# Altium footprint library HW_HOLLAND_NCDM_MONITOR_R1.PcbLib: 472 footprints (part 3 of 30)
Each footprint in its own frame and in the unit in brackets; x right, y up, seen from the top. Pads: shape width x height; smd on the part's side, far side on the other; paste and mask are expansions set on the pad; w line width, h text height; cw(c..) or ccw(c..) is an arc to the next point about the centre after c.
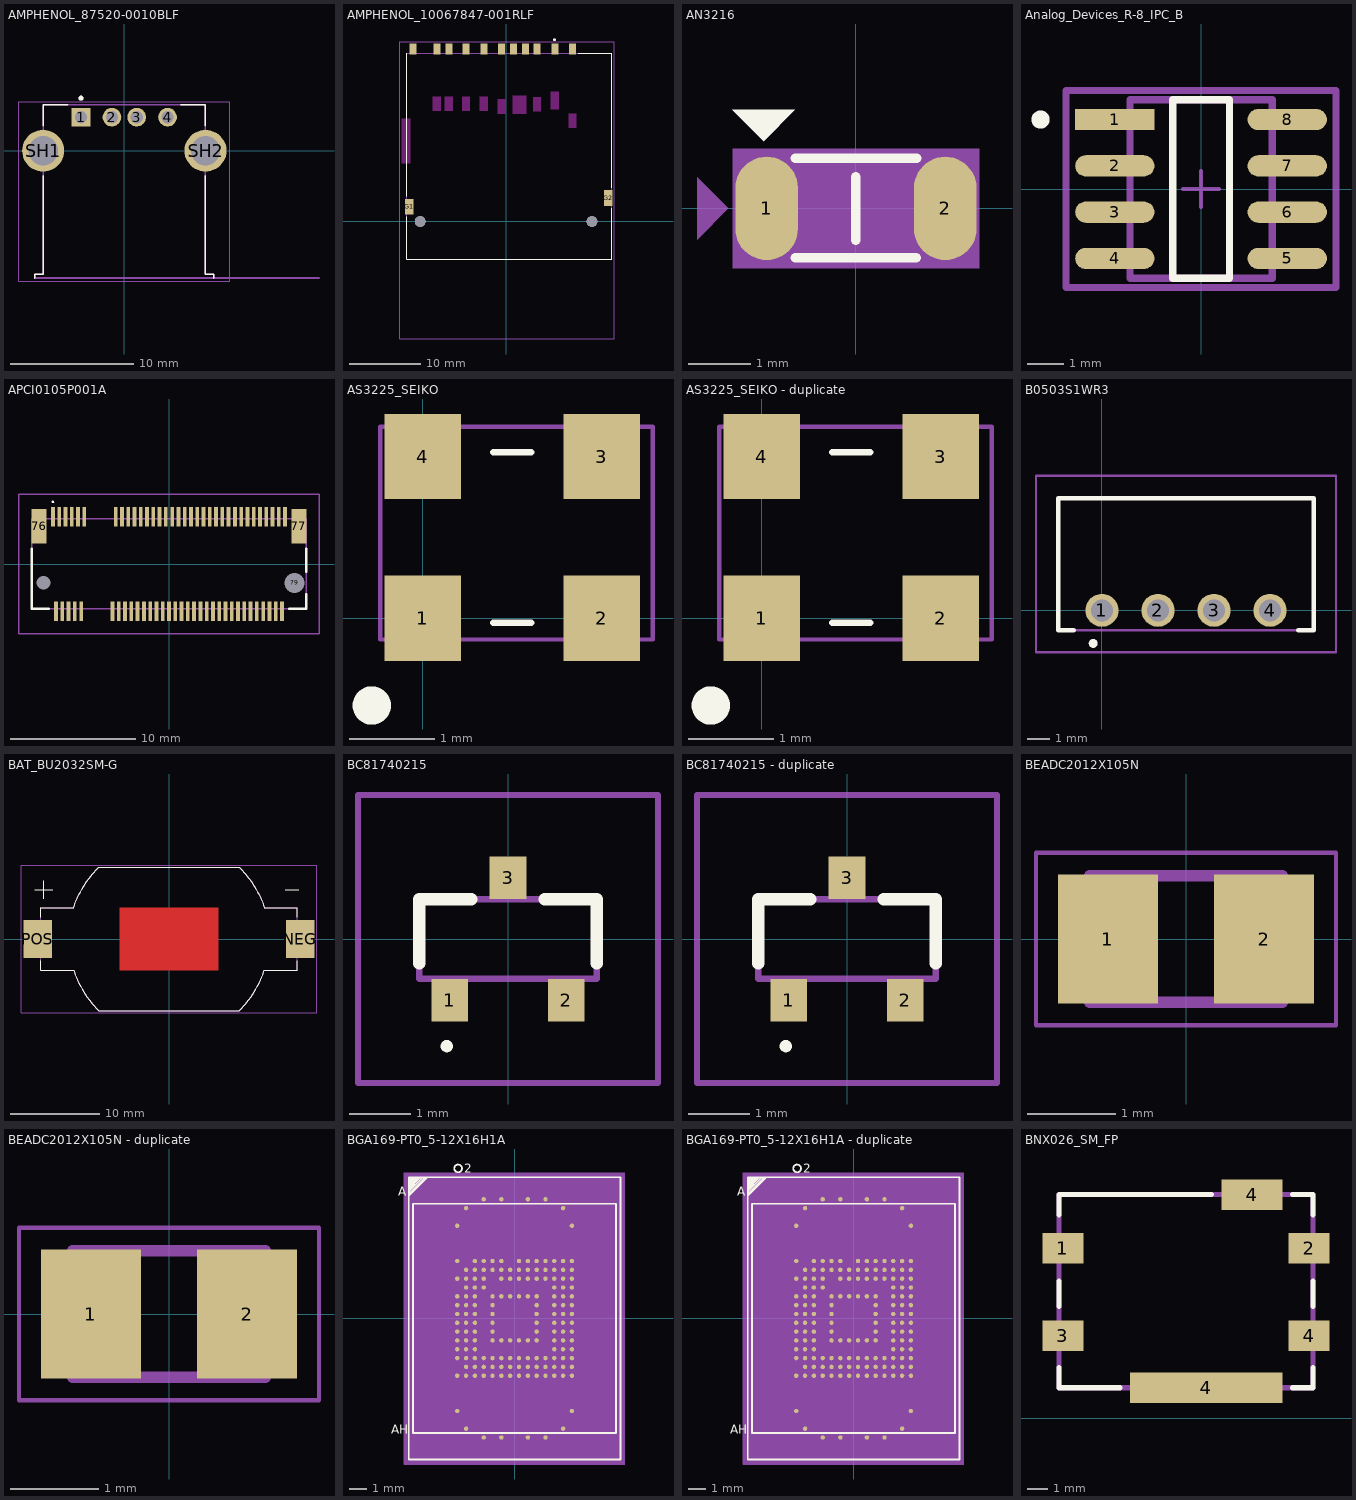
[diagram p2: the footprints below, top view; thin cyan lines are the x and y axes]

## AMPHENOL_87520-0010BLF [mm]
height 7.7
pads (6):
  rect 1.508x1.508 / inner round 1.508 / far side rect 1.508x1.508 hole 1 mask+0.05: 1(-3.5,2.71)
  round 1.508 hole 1 mask+0.05: 2(-1,2.71) 3(1,2.71) 4(3.5,2.71)
  round 3.396 hole 2.38 mask+0.05: SH1(-6.57,0) SH2(6.57,0)
Top Overlay:
  circle w0.2: c-3.5,4.25 r0.1
  lines w0.127: -7.25,-10.3 -7.25,-10 -6.55,-10 -6.55,-2.018 ; -6.55,2.018 -6.55,3.7 -4.574,3.7 ; 4.574,3.7 6.55,3.7 6.55,2.018 ; 6.55,-2.018 6.55,-10 7.25,-10 7.25,-10.3
Mechanical 13:
  circle w0.2: c-3.5,4.25 r0.1
  lines w0.127: 15.75,-10.3 7.25,-10.3 ; 7.25,-10.3 7.25,-10 6.55,-10 6.55,3.7 -6.55,3.7 -6.55,-10 -7.25,-10 -7.25,-10.3 7.25,-10.3
  text "PCB EDGE" at 8.6,-10.2 h1
Mechanical 15:
  lines w0.05: -8.518,-10.55 8.518,-10.55 8.518,3.95 -8.518,3.95 -8.518,-10.55
3D body "step_temp.STEP": height 7.7, standoff -2.78, extent -7.239,-10.302 7.261,3.698

## AMPHENOL_10067847-001RLF [mm]
pads (15):
  rect 1x1.5 smd: 1(6.875,24.3) 2(4.375,24.3) 3(1.075,24.3) 4(-0.625,24.3) 5(-3.125,24.3) 6(-5.625,24.3) 7(-8.05,24.3) 8(-9.75,24.3) 9(9.375,24.3) CD(2.725,24.3) WP(-13.1,24.3)
  rect 1.2x2.2 smd: G1(-13.6,2.1) G2(14.4,3.3)
  round 1.5 hole 1.5 unplated: ""(-12.1,0) ""(12.1,0)
Top Overlay:
  circle w0.2: c6.8,25.6 r0.1
  lines w0.127: -14,0.68 -14,-5.3 14.9,-5.3 14.9,1.88 ; -14,3.52 -14,23.7 ; 10.195,23.7 14.9,23.7 14.9,4.72
Keep-Out Layer:
  region: -13.5,8.2 -14.7,8.2 -14.7,14.5 -13.5,14.5
  region: 4.92,15.5 3.82,15.5 3.82,17.5 4.92,17.5
  region: 7.42,15.8 6.32,15.8 6.32,18.3 7.42,18.3
  region: 9.92,13.2 8.82,13.2 8.82,15.2 9.92,15.2
  region: 2.82,15.2 0.92,15.2 0.92,17.7 2.82,17.7
  region: -2.58,15.6 -3.68,15.6 -3.68,17.6 -2.58,17.6
  region: -0.08,15.2 -1.18,15.2 -1.18,17.2 -0.08,17.2
  region: -5.08,15.6 -6.18,15.6 -6.18,17.6 -5.08,17.6
  region: -7.51,15.6 -8.61,15.6 -8.61,17.6 -7.51,17.6
  region: -9.21,15.6 -10.31,15.6 -10.31,17.6 -9.21,17.6
  region: -13.5,8.2 -14.7,8.2 -14.7,14.5 -13.5,14.5
  region: 4.92,15.5 3.82,15.5 3.82,17.5 4.92,17.5
  region: 7.42,15.8 6.32,15.8 6.32,18.3 7.42,18.3
  region: 9.92,13.2 8.82,13.2 8.82,15.2 9.92,15.2
  region: 2.82,15.2 0.92,15.2 0.92,17.7 2.82,17.7
  region: -2.58,15.6 -3.68,15.6 -3.68,17.6 -2.58,17.6
  region: -0.08,15.2 -1.18,15.2 -1.18,17.2 -0.08,17.2
  region: -5.08,15.6 -6.18,15.6 -6.18,17.6 -5.08,17.6
  region: -7.51,15.6 -8.61,15.6 -8.61,17.6 -7.51,17.6
  region: -9.21,15.6 -10.31,15.6 -10.31,17.6 -9.21,17.6
Mechanical 13:
  circle w0.2: c6.8,25.6 r0.1
  lines w0.127: -14,-5.3 -14,23.7 14.9,23.7 14.9,-5.3 -14,-5.3
Mechanical 15:
  lines w0.05: -14.95,-16.55 -14.95,25.3 15.25,25.3 15.25,-16.55 -14.95,-16.55
3D body "10067847-001RLF--3DModel-STEP-533217.STEP": height 2.91, standoff -0.69, extent -13.8,-5.5 14.65,24.75

## AN3216 [mm]
pads (2):
  oval 1x1.65 smd: 1(-1.425,0) 2(1.425,0)
Top Overlay:
  dashed: -0.973,1.571 -1.973,1.571 -1.473,1.071
  lines w0.152: -0.97,-0.79 0.96,-0.79 ; -0.97,0.8 0.97,0.8 ; 0,-0.51 0,0.508
Top Assembly:
  dashed: -2.536,0.5 -2.536,-0.5 -2.036,0
  lines w0.025: -1.6,-0.8 1.6,-0.8 1.6,0.8 -1.6,0.8 -1.6,-0.8
  text ".Designator" at -0.953,-0.212 h0.64
Top 3D Body:
  region: -1.968,0.953 -1.968,-0.953 1.968,-0.953 1.968,0.953
Mechanical 17:
  text "1" at -1.006,0.001 h0.89
  text "2" at 1.845,-0.001 h0.89
3D body: height 3.81, standoff 0, extent -1.968,-0.953 1.968,0.953

## Analog_Devices_R-8_IPC_B [mm]
pads (8):
  rect 2.174x0.582 smd paste+0 mask+0: 1(-2.366,1.905)
  rrect100% 2.174x0.582 smd paste+0 mask+0: 2(-2.366,0.635) 3(-2.366,-0.635) 4(-2.366,-1.905) 5(2.366,-1.905) 6(2.366,-0.635) 7(2.366,0.635) 8(2.366,1.905)
Top Overlay:
  circle w0.25: c-4.403,1.905 r0.125
  lines w0.2: -0.779,-2.45 -0.779,2.45 0.779,2.45 0.779,-2.45 -0.779,-2.45
Top Courtyard:
  lines w0.2: -3.703,-2.7 -3.703,2.7 3.703,2.7 3.703,-2.7 -3.703,-2.7
  text ".Designator" at 0,0.235 h1.25
Mechanical 12:
  lines w0.2: -1.95,-2.45 -1.95,2.45 1.95,2.45 1.95,-2.45 -1.95,-2.45
Mechanical 15:
  lines w0.1: -0.5,0 0.5,0 ; 0,-0.5 0,0.5
  lines w0.2: -3.703,-2.7 -3.703,2.7 3.703,2.7 3.703,-2.7 -3.703,-2.7
3D body "IC_Analog_Devices_ADM4855ARZ_eec.STEP": height 1.75, standoff 0, extent -3,-2.45 3,2.45

## APCI0105P001A [mm]
pads (71):
  rect 0.3x1.55 smd: 1(-9.25,3.775) 2(-9,-3.775) 3(-8.75,3.775) 4(-8.5,-3.775) 5(-8.25,3.775) 6(-8,-3.775) 7(-7.75,3.775) 8(-7.5,-3.775) 9(-7.25,3.775) 10(-7,-3.775) 11(-6.75,3.775) 20(-4.5,-3.775) 21(-4.25,3.775) 22(-4,-3.775) 23(-3.75,3.775) 24(-3.5,-3.775) 25(-3.25,3.775) 26(-3,-3.775) 27(-2.75,3.775) 28(-2.5,-3.775) 29(-2.25,3.775) 30(-2,-3.775) 31(-1.75,3.775) 32(-1.5,-3.775) 33(-1.25,3.775) 34(-1,-3.775) 35(-0.75,3.775) 36(-0.5,-3.775) 37(-0.25,3.775) 38(0,-3.775) 39(0.25,3.775) 40(0.5,-3.775) 41(0.75,3.775) 42(1,-3.775) 43(1.25,3.775) 44(1.5,-3.775) 45(1.75,3.775) 46(2,-3.775) 47(2.25,3.775) 48(2.5,-3.775) 49(2.75,3.775) 50(3,-3.775) 51(3.25,3.775) 52(3.5,-3.775) 53(3.75,3.775) 54(4,-3.775) 55(4.25,3.775) 56(4.5,-3.775) 57(4.75,3.775) 58(5,-3.775) 59(5.25,3.775) 60(5.5,-3.775) 61(5.75,3.775) 62(6,-3.775) 63(6.25,3.775) 64(6.5,-3.775) 65(6.75,3.775) 66(7,-3.775) 67(7.25,3.775) 68(7.5,-3.775) 69(7.75,3.775) 70(8,-3.775) 71(8.25,3.775) 72(8.5,-3.775) 73(8.75,3.775) 74(9,-3.775) 75(9.25,3.775)
  rect 1.2x2.75 smd: 76(-10.35,3) 77(10.35,3)
  round 0.55 hole 1.1 unplated: 78(-10,-1.5)
  round 0.8 hole 1.6 unplated: 79(10,-1.5)
Top Overlay:
  lines w0.1: -9.25,4.9 cw(c-9.25,4.95) -9.25,5 cw(c-9.25,4.95) -9.25,4.9
  lines w0.2: -10.925,1.2 -10.925,-3.55 -9.6,-3.55 ; 9.6,-3.55 10.925,-3.55 10.925,-2.4 ; 10.925,-0.6 10.925,1.2
Mechanical 13:
  lines w0.1: -10.925,-3.55 -10.925,3.6 10.925,3.6 10.925,-3.55 -10.925,-3.55
Mechanical 15:
  lines w0.1: -11.95,-5.55 -11.95,5.55 11.95,5.55 11.95,-5.55 -11.95,-5.55
3D body "Conn_TE_Connectivity_2199119-3_eec.STEP": height 0.25, standoff 0, extent -11.1,-4.65 11.1,4.65

## AS3225_SEIKO [mm]
pads (4):
  rect 0.9x1 smd: 1(0,0) 2(2.1,0) 3(2.1,1.9) 4(0,1.9)
Top Overlay:
  circle w0.25: c-0.6,-1.025 r0.1
  lines w0.076: 0.825,-0.05 1.275,-0.05 ; 0.825,1.95 1.275,1.95
Mechanical 15:
  lines w0.05: -0.5,-0.25 -0.5,2.25 2.7,2.25 2.7,-0.25 -0.5,-0.25
3D body "3225 SMD Crystal Oscillator.STEP": height 0.7, standoff 0, extent -0.55,-0.3 2.65,2.2

## AS3225_SEIKO - duplicate [mm]
pads (4):
  rect 0.9x1 smd: 1(0,0) 2(2.1,0) 3(2.1,1.9) 4(0,1.9)
Top Overlay:
  circle w0.25: c-0.6,-1.025 r0.1
  lines w0.076: 0.825,-0.05 1.275,-0.05 ; 0.825,1.95 1.275,1.95
Mechanical 15:
  lines w0.05: -0.5,-0.25 2.7,-0.25 2.7,2.25 -0.5,2.25 -0.5,-0.25
3D body "3225 SMD Crystal Oscillator.STEP": height 0.7, standoff 0, extent -0.55,-0.3 2.65,2.2

## B0503S1WR3 [mm]
pads (4):
  round 1.5 hole 1: 1(0,0) 2(2.54,0) 3(5.08,0) 4(7.62,0)
Top Overlay:
  lines w0.2: -1.27,-0.9 -1.99,-0.9 -1.99,5.08 9.61,5.08 9.61,-0.9 8.89,-0.9 ; -0.5,-1.5 ccw(c-0.4,-1.5) -0.3,-1.5 ccw(c-0.4,-1.5) -0.5,-1.5
Mechanical 13:
  lines w0.1: -1.99,-0.9 9.61,-0.9 9.61,5.1 -1.99,5.1 -1.99,-0.9
Mechanical 15:
  lines w0.1: -2.99,-1.9 10.61,-1.9 10.61,6.1 -2.99,6.1 -2.99,-1.9
3D body "B0503S-1WR3.stp": height 10.51, standoff -5, extent -1.99,-0.9 9.61,5.1

## BAT_BU2032SM-G [mm]
pads (2):
  rect 3.2x4.2 smd: NEG(14.65,0) POS(-14.65,0)
Top Layer:
  region: 5.5,-3.5 -5.5,-3.5 -5.5,3.5 5.5,3.5
Top Overlay:
  lines w0.127: -15,5.5 -13,5.5 ; -14.3,-2.42 -14.3,-3.5 -10.645,-3.5 -10.581,-3.681 -10.458,-4.024 -10.35,-4.287 -10.242,-4.538 -10.058,-4.937 -9.88,-5.282 -9.7,-5.594 -9.524,-5.892 -9.168,-6.436 -8.897,-6.809 -8.516,-7.277 -8.022,-7.82 -7.838,-8 ; -14.3,2.42 -14.3,3.5 -10.645,3.5 -10.581,3.681 -10.458,4.024 -10.35,4.287 -10.242,4.538 -10.058,4.937 -9.88,5.282 -9.7,5.594 -9.524,5.892 -9.168,6.436 -8.897,6.809 -8.516,7.277 -8.022,7.82 -7.838,8 ; -14,4.5 -14,6.5 ; -7.835,-8 7.835,-8 ; -7.835,8 7.835,8 ; 7.838,-8 8.022,-7.82 8.516,-7.277 8.897,-6.809 9.168,-6.436 9.524,-5.892 9.7,-5.594 9.88,-5.282 10.058,-4.937 10.242,-4.538 10.35,-4.287 10.458,-4.024 10.581,-3.681 10.645,-3.5 14.3,-3.5 14.3,-2.42 ; 7.838,8 8.022,7.82 8.516,7.277 8.897,6.809 9.168,6.436 9.524,5.892 9.7,5.594 9.88,5.282 10.058,4.937 10.242,4.538 10.35,4.287 10.458,4.024 10.581,3.681 10.645,3.5 14.3,3.5 14.3,2.42 ; 13,5.5 14.5,5.5
Top Solder:
  region: 5.6,-3.6 -5.6,-3.6 -5.6,3.6 5.6,3.6
Mechanical 13:
  lines w0.127: -7.838,-8 -8.022,-7.82 -8.516,-7.277 -8.897,-6.809 -9.168,-6.436 -9.524,-5.892 -9.7,-5.594 -9.88,-5.282 -10.058,-4.937 -10.242,-4.538 -10.35,-4.287 -10.458,-4.024 -10.581,-3.681 -10.645,-3.5 -14.3,-3.5 -14.3,3.5 -10.645,3.5 -10.581,3.681 -10.458,4.024 -10.35,4.287 -10.242,4.538 -10.058,4.937 -9.88,5.282 -9.7,5.594 -9.524,5.892 -9.168,6.436 -8.897,6.809 -8.516,7.277 -8.022,7.82 -7.838,8 ; -7.835,-8 7.835,-8 ; -7.835,8 7.835,8 ; 7.838,-8 8.022,-7.82 8.516,-7.277 8.897,-6.809 9.168,-6.436 9.524,-5.892 9.7,-5.594 9.88,-5.282 10.058,-4.937 10.242,-4.538 10.35,-4.287 10.458,-4.024 10.581,-3.681 10.645,-3.5 14.3,-3.5 14.3,3.5 10.645,3.5 10.581,3.681 10.458,4.024 10.35,4.287 10.242,4.538 10.058,4.937 9.88,5.282 9.7,5.594 9.524,5.892 9.168,6.436 8.897,6.809 8.516,7.277 8.022,7.82 7.838,8
Mechanical 15:
  lines w0.05: -16.5,-8.25 -16.5,8.25 16.5,8.25 16.5,-8.25 -16.5,-8.25
3D body "BU2032SM-G--3DModel-STEP-1.STEP": height 5.21, standoff 0.01, extent -15.8,-8 15.8,8
3D body "CR2032--3DModel-STEP-56544.STEP": height 4.21, standoff 1.01, extent -10,-10 10,10

## BC81740215 [mm]
pads (3):
  rect 0.6x0.7 smd: 1(-0.95,-1) 2(0.95,-1) 3(0,1)
Top Overlay:
  lines w0.1: -1,-1.8 ccw(c-1,-1.75) -1,-1.7 ccw(c-1,-1.75) -1,-1.8
  lines w0.2: -1.45,-0.4 -1.45,0.65 -0.6,0.65 ; 0.6,0.65 1.45,0.65 1.45,-0.4
Mechanical 15:
  lines w0.1: -1.45,-0.65 1.45,-0.65 1.45,0.65 -1.45,0.65 -1.45,-0.65
Mechanical 20:
  lines w0.1: -2.45,-2.35 2.45,-2.35 2.45,2.35 -2.45,2.35 -2.45,-2.35
3D body "BC817-40-TP.stp": height 0.89, standoff -0.01, extent -1.4,-1.05 1.4,1.05

## BC81740215 - duplicate [mm]
pads (3):
  rect 0.6x0.7 smd: 1(-0.95,-1) 2(0.95,-1) 3(0,1)
Top Overlay:
  lines w0.1: -1,-1.8 ccw(c-1,-1.75) -1,-1.7 ccw(c-1,-1.75) -1,-1.8
  lines w0.2: -1.45,-0.4 -1.45,0.65 -0.6,0.65 ; 0.6,0.65 1.45,0.65 1.45,-0.4
Mechanical 15:
  lines w0.1: -1.45,-0.65 1.45,-0.65 1.45,0.65 -1.45,0.65 -1.45,-0.65
Mechanical 20:
  lines w0.1: -2.45,-2.35 2.45,-2.35 2.45,2.35 -2.45,2.35 -2.45,-2.35
3D body "BC817-40-TP.stp": height 0.89, standoff -0.01, extent -1.4,-1.05 1.4,1.05

## BEADC2012X105N [mm]
pads (2):
  rect 1.14x1.47 smd: 1(-0.89,0) 2(0.89,0)
Mechanical 13:
  lines w0.127: -1.1,-0.72 -1.1,0.72 1.1,0.72 1.1,-0.72 -1.1,-0.72
Mechanical 15:
  lines w0.05: -1.708,-0.983 -1.708,0.983 1.708,0.983 1.708,-0.983 -1.708,-0.983
3D body "step_temp.STEP": height 1.05, standoff 0, extent -1,-0.625 1,0.625

## BEADC2012X105N - duplicate [mm]
pads (2):
  rect 1.14x1.47 smd: 1(-0.89,0) 2(0.89,0)
Mechanical 13:
  lines w0.127: -1.1,-0.72 -1.1,0.72 1.1,0.72 1.1,-0.72 -1.1,-0.72
Mechanical 15:
  lines w0.05: -1.708,-0.983 -1.708,0.983 1.708,0.983 1.708,-0.983 -1.708,-0.983
3D body "step_temp.STEP": height 1.05, standoff 0, extent -1,-0.625 1,0.625

## BGA169-PT0_5-12X16H1A [mm]
pads (163):
  round 0.25 smd: A4(-1.75,6.75) A6(-0.75,6.75) A9(0.75,6.75) A11(1.75,6.75) AA1(-3.25,-3.25) AA2(-2.75,-3.25) AA3(-2.25,-3.25) AA4(-1.75,-3.25) AA5(-1.25,-3.25) AA6(-0.75,-3.25) AA7(-0.25,-3.25) AA8(0.25,-3.25) AA9(0.75,-3.25) AA10(1.25,-3.25) AA11(1.75,-3.25) AA12(2.25,-3.25) AA13(2.75,-3.25) AA14(3.25,-3.25) AE1(-3.25,-5.25) AE14(3.25,-5.25) AG2(-2.75,-6.25) AG13(2.75,-6.25) AH4(-1.75,-6.75) AH6(-0.75,-6.75) AH9(0.75,-6.75) AH11(1.75,-6.75) B2(-2.75,6.25) B13(2.75,6.25) D1(-3.25,5.25) D14(3.25,5.25) H1(-3.25,3.25) H3(-2.25,3.25) H4(-1.75,3.25) H5(-1.25,3.25) H6(-0.75,3.25) H8(0.25,3.25) H9(0.75,3.25) H10(1.25,3.25) H11(1.75,3.25) H12(2.25,3.25) H13(2.75,3.25) H14(3.25,3.25) J2(-2.75,2.75) J3(-2.25,2.75) J4(-1.75,2.75) J5(-1.25,2.75) J6(-0.75,2.75) J7(-0.25,2.75) J8(0.25,2.75) J9(0.75,2.75) J10(1.25,2.75) J11(1.75,2.75) J12(2.25,2.75) J13(2.75,2.75) J14(3.25,2.75) K1(-3.25,2.25) K2(-2.75,2.25) K3(-2.25,2.25) K4(-1.75,2.25) K6(-0.75,2.25) K7(-0.25,2.25) K8(0.25,2.25) K9(0.75,2.25) K10(1.25,2.25) K11(1.75,2.25) K12(2.25,2.25) K13(2.75,2.25) K14(3.25,2.25) L2(-2.75,1.75) L3(-2.25,1.75) L4(-1.75,1.75) L12(2.25,1.75) L13(2.75,1.75) L14(3.25,1.75) M1(-3.25,1.25) M2(-2.75,1.25) M3(-2.25,1.25) M5(-1.25,1.25) M6(-0.75,1.25) M7(-0.25,1.25) M8(0.25,1.25) M9(0.75,1.25) M10(1.25,1.25) M12(2.25,1.25) M13(2.75,1.25) M14(3.25,1.25) N1(-3.25,0.75) N2(-2.75,0.75) N3(-2.25,0.75) N5(-1.25,0.75) N10(1.25,0.75) N12(2.25,0.75) N13(2.75,0.75) N14(3.25,0.75) P1(-3.25,0.25) P2(-2.75,0.25) P3(-2.25,0.25) P5(-1.25,0.25) P10(1.25,0.25) P12(2.25,0.25) P13(2.75,0.25) P14(3.25,0.25) R1(-3.25,-0.25) R2(-2.75,-0.25) R3(-2.25,-0.25) R5(-1.25,-0.25) R10(1.25,-0.25) R12(2.25,-0.25) R13(2.75,-0.25) R14(3.25,-0.25) T1(-3.25,-0.75) T2(-2.75,-0.75) T3(-2.25,-0.75) T5(-1.25,-0.75) T10(1.25,-0.75) T12(2.25,-0.75) T13(2.75,-0.75) T14(3.25,-0.75) U1(-3.25,-1.25) U2(-2.75,-1.25) U3(-2.25,-1.25) U5(-1.25,-1.25) U6(-0.75,-1.25) U7(-0.25,-1.25) U8(0.25,-1.25) U9(0.75,-1.25) U10(1.25,-1.25) U12(2.25,-1.25) U13(2.75,-1.25) U14(3.25,-1.25) V1(-3.25,-1.75) V2(-2.75,-1.75) V3(-2.25,-1.75) V12(2.25,-1.75) V13(2.75,-1.75) V14(3.25,-1.75) W1(-3.25,-2.25) W2(-2.75,-2.25) W3(-2.25,-2.25) W4(-1.75,-2.25) W5(-1.25,-2.25) W6(-0.75,-2.25) W7(-0.25,-2.25) W8(0.25,-2.25) W9(0.75,-2.25) W10(1.25,-2.25) W11(1.75,-2.25) W12(2.25,-2.25) W13(2.75,-2.25) W14(3.25,-2.25) Y2(-2.75,-2.75) Y3(-2.25,-2.75) Y4(-1.75,-2.75) Y5(-1.25,-2.75) Y6(-0.75,-2.75) Y7(-0.25,-2.75) Y8(0.25,-2.75) Y9(0.75,-2.75) Y10(1.25,-2.75) Y11(1.75,-2.75) Y12(2.25,-2.75) Y13(2.75,-2.75) Y14(3.25,-2.75)
Top Overlay:
  circle w0.1: c-3.2,8.5 r0.219
  lines w0.1: -6,7.05 -5.04,8 ; -6,7.31 -5.335,7.985 ; -6,7.43 -5.435,7.995 ; -6,7.56 -5.56,8 ; -6,7.69 -5.69,8 ; -6,7.79 -5.79,8 ; -6,7.89 -5.89,8 ; -5.99,7.19 -5.194,7.986 ; -5.988,6.952 -4.934,7.997 ; -6,-8 -6,8 6,8 6,-8 -6,-8 ; -5.75,-6.5 -5.75,6.5 5.75,6.5 5.75,-6.5 -5.75,-6.5
  text "AH" at -7,-6.55 h0.5
  text "A" at -6.6,6.95 h0.5
  text "2" at -2.85,8.25 h0.5
Top Assembly:
  lines w0.025: -6,-8 -6,8 6,8 6,-8 -6,-8
Mechanical 19:
  text "U5" at -1.25,-1.41 h0.2
  text "R5" at -1.25,-0.41 h0.2
  text "K2" at -2.75,2.09 h0.2
  text "W4" at -1.75,-2.41 h0.2
  text "Y4" at -1.75,-2.91 h0.2
  text "AA3" at -2.25,-3.49 h0.2
  text "AA5" at -1.25,-3.49 h0.2
  text "U9" at 0.75,-1.41 h0.2
  text "T10" at 1.25,-0.99 h0.2
  text "K6" at -0.75,2.09 h0.2
  text "M6" at -0.75,1.09 h0.2
  text "N5" at -1.25,0.59 h0.2
  text "K4" at -1.75,2.09 h0.2
  text "M7" at -0.25,1.09 h0.2
  text "P5" at -1.25,0.09 h0.2
  text "R10" at 1.25,-0.49 h0.2
  text "U8" at 0.25,-1.41 h0.2
  text "Y2" at -2.75,-2.91 h0.2
  text "Y5" at -1.25,-2.91 h0.2
  text "AA4" at -1.75,-3.49 h0.2
  text "AA6" at -0.75,-3.49 h0.2
  text "R3" at -2.25,-0.41 h0.2
  text "N14" at 3.25,0.51 h0.2
  text "AA12" at 2.25,-3.57 h0.2
  text "AA9" at 0.75,-3.49 h0.2
  text "Y6" at -0.75,-2.91 h0.2
  text "V14" at 3.25,-1.99 h0.2
  text "T14" at 3.25,-0.99 h0.2
  text "L14" at 3.25,1.51 h0.2
  text "H12" at 2.25,3.01 h0.2
  text "H9" at 0.75,3.09 h0.2
  text "H10" at 1.25,3.01 h0.2
  text "K1" at -3.25,2.09 h0.2
  text "R14" at 3.25,-0.49 h0.2
  text "U2" at -2.75,-1.41 h0.2
  text "W1" at -3.25,-2.41 h0.2
  text "AA8" at 0.25,-3.49 h0.2
  text "Y13" at 2.75,-2.99 h0.2
  text "W14" at 3.25,-2.49 h0.2
  text "R13" at 2.75,-0.49 h0.2
  text "R1" at -3.25,-0.41 h0.2
  text "P13" at 2.75,0.01 h0.2
  text "K14" at 3.25,2.01 h0.2
  text "J13" at 2.75,2.51 h0.2
  text "H8" at 0.25,3.09 h0.2
  text "H11" at 1.75,3.01 h0.2
  text "P14" at 3.25,0.01 h0.2
  text "W2" at -2.75,-2.41 h0.2
  text "AA11" at 1.75,-3.57 h0.2
  text "N1" at -3.25,0.59 h0.2
  text "L4" at -1.75,1.59 h0.2
  text "R2" at -2.75,-0.41 h0.2
  text "Y14" at 3.25,-2.99 h0.2
  text "U7" at -0.25,-1.41 h0.2
  text "U6" at -0.75,-1.41 h0.2
  text "U10" at 1.25,-1.49 h0.2
  text "P3" at -2.25,0.09 h0.2
  text "P10" at 1.25,0.01 h0.2
  text "N10" at 1.25,0.51 h0.2
  text "M9" at 0.75,1.09 h0.2
  text "M8" at 0.25,1.09 h0.2
  text "M5" at -1.25,1.09 h0.2
  text "M10" at 1.25,1.01 h0.2
  text "J14" at 3.25,2.51 h0.2
  text "H13" at 2.75,3.01 h0.2
  text "AA7" at -0.25,-3.49 h0.2
  text "AA2" at -2.75,-3.49 h0.2
  text "AA13" at 2.75,-3.57 h0.2
  text "AA10" at 1.25,-3.57 h0.2
  text "J11" at 1.75,2.51 h0.2
  text "N12" at 2.25,0.51 h0.2
  text "T12" at 2.25,-0.99 h0.2
  text "Y11" at 1.75,-2.99 h0.2
  text "K11" at 1.75,2.01 h0.2
  text "N13" at 2.75,0.51 h0.2
  text "T13" at 2.75,-0.99 h0.2
  text "W11" at 1.75,-2.49 h0.2
  text "W12" at 2.25,-2.49 h0.2
  text "Y12" at 2.25,-2.99 h0.2
  text "W10" at 1.25,-2.49 h0.2
  text "Y10" at 1.25,-2.99 h0.2
  text "W9" at 0.75,-2.41 h0.2
  text "Y9" at 0.75,-2.91 h0.2
  text "K7" at -0.25,2.09 h0.2
  text "J7" at -0.25,2.59 h0.2
  text "W8" at 0.25,-2.41 h0.2
  text "K8" at 0.25,2.09 h0.2
  text "J8" at 0.25,2.59 h0.2
  text "K9" at 0.75,2.09 h0.2
  text "J9" at 0.75,2.59 h0.2
  text "K10" at 1.25,2.01 h0.2
  text "J10" at 1.25,2.51 h0.2
  text "J12" at 2.25,2.51 h0.2
  text "K12" at 2.25,2.01 h0.2
  text "K13" at 2.75,2.01 h0.2
  text "L13" at 2.75,1.51 h0.2
  text "Y8" at 0.25,-2.91 h0.2
  text "L12" at 2.25,1.51 h0.2
  text "M12" at 2.25,1.01 h0.2
  text "M13" at 2.75,1.01 h0.2
  text "M14" at 3.25,1.01 h0.2
  text "U14" at 3.25,-1.49 h0.2
  text "U13" at 2.75,-1.49 h0.2
  text "U12" at 2.25,-1.49 h0.2
  text "V13" at 2.75,-1.99 h0.2
  text "V12" at 2.25,-1.99 h0.2
  text "W13" at 2.75,-2.49 h0.2
  text "W7" at -0.25,-2.41 h0.2
  text "Y7" at -0.25,-2.91 h0.2
  text "H14" at 3.25,3.01 h0.2
  text "H1" at -3.25,3.09 h0.2
  text "D14" at 3.25,5.01 h0.2
  text "D1" at -3.25,5.09 h0.2
  text "B2" at -2.75,6.09 h0.2
  text "B13" at 2.75,6.01 h0.2
  text "AH9" at 0.75,-6.99 h0.2
  text "AH6" at -0.75,-6.99 h0.2
  text "AH4" at -1.75,-6.99 h0.2
  text "AH11" at 1.75,-7.07 h0.2
  text "AG2" at -2.75,-6.49 h0.2
  text "AG13" at 2.75,-6.57 h0.2
  text "AE14" at 3.25,-5.57 h0.2
  text "AE1" at -3.25,-5.49 h0.2
  text "AA14" at 3.25,-3.57 h0.2
  text "AA1" at -3.25,-3.49 h0.2
  text "A9" at 0.75,6.59 h0.2
  text "A6" at -0.75,6.59 h0.2
  text "A4" at -1.75,6.59 h0.2
  text "A11" at 1.75,6.51 h0.2
  text "J6" at -0.75,2.59 h0.2
  text "J5" at -1.25,2.59 h0.2
  text "J4" at -1.75,2.59 h0.2
  text "J3" at -2.25,2.59 h0.2
  text "R12" at 2.25,-0.49 h0.2
  text "P12" at 2.25,0.01 h0.2
  text "T1" at -3.25,-0.91 h0.2
  text "P1" at -3.25,0.09 h0.2
  text "T3" at -2.25,-0.91 h0.2
  text "P2" at -2.75,0.09 h0.2
  text "T2" at -2.75,-0.91 h0.2
  text "U1" at -3.25,-1.41 h0.2
  text "V1" at -3.25,-1.91 h0.2
  text "N3" at -2.25,0.59 h0.2
  text "M3" at -2.25,1.09 h0.2
  text "L3" at -2.25,1.59 h0.2
  text "L2" at -2.75,1.59 h0.2
  text "K3" at -2.25,2.09 h0.2
  text "Y3" at -2.25,-2.91 h0.2
  text "W3" at -2.25,-2.41 h0.2
  text "N2" at -2.75,0.59 h0.2
  text "M1" at -3.25,1.09 h0.2
  text "M2" at -2.75,1.09 h0.2
  text "U3" at -2.25,-1.41 h0.2
  text "V3" at -2.25,-1.91 h0.2
  text "V2" at -2.75,-1.91 h0.2
  text "H3" at -2.25,3.09 h0.2
  text "H4" at -1.75,3.09 h0.2
  text "J2" at -2.75,2.59 h0.2
  text "W5" at -1.25,-2.41 h0.2
  text "W6" at -0.75,-2.41 h0.2
  text "H5" at -1.25,3.09 h0.2
  text "H6" at -0.75,3.09 h0.2
  text "T5" at -1.25,-0.91 h0.2
Mechanical 23:
  lines w0.025: -6.254,-8.254 -6.254,8.254 ; -6.254,-8.254 6.254,-8.254 ; -6.254,-8.254 -6.254,8.254 ; -6.254,-8.254 6.254,-8.254 ; -6.254,-8.254 -6.254,8.254 ; -6.254,-8.254 6.254,-8.254 ; -6.254,8.254 6.254,8.254 ; -6.254,8.254 6.254,8.254 ; -6.254,8.254 6.254,8.254 ; 6.254,-8.254 6.254,8.254 ; 6.254,-8.254 6.254,8.254 ; 6.254,-8.254 6.254,8.254
Mechanical 24:
  dashed: -6.254,-8.254 6.254,-8.254 6.254,8.254 -6.254,8.254
3D body "User Library-BGA153NP50_14X14_1300X1150X80B30.step": height 0.8, standoff 0, extent -5.75,-6.5 5.75,6.5

## BGA169-PT0_5-12X16H1A - duplicate [mm]
pads (163):
  round 0.25 smd: A4(-1.75,6.75) A6(-0.75,6.75) A9(0.75,6.75) A11(1.75,6.75) AA1(-3.25,-3.25) AA2(-2.75,-3.25) AA3(-2.25,-3.25) AA4(-1.75,-3.25) AA5(-1.25,-3.25) AA6(-0.75,-3.25) AA7(-0.25,-3.25) AA8(0.25,-3.25) AA9(0.75,-3.25) AA10(1.25,-3.25) AA11(1.75,-3.25) AA12(2.25,-3.25) AA13(2.75,-3.25) AA14(3.25,-3.25) AE1(-3.25,-5.25) AE14(3.25,-5.25) AG2(-2.75,-6.25) AG13(2.75,-6.25) AH4(-1.75,-6.75) AH6(-0.75,-6.75) AH9(0.75,-6.75) AH11(1.75,-6.75) B2(-2.75,6.25) B13(2.75,6.25) D1(-3.25,5.25) D14(3.25,5.25) H1(-3.25,3.25) H3(-2.25,3.25) H4(-1.75,3.25) H5(-1.25,3.25) H6(-0.75,3.25) H8(0.25,3.25) H9(0.75,3.25) H10(1.25,3.25) H11(1.75,3.25) H12(2.25,3.25) H13(2.75,3.25) H14(3.25,3.25) J2(-2.75,2.75) J3(-2.25,2.75) J4(-1.75,2.75) J5(-1.25,2.75) J6(-0.75,2.75) J7(-0.25,2.75) J8(0.25,2.75) J9(0.75,2.75) J10(1.25,2.75) J11(1.75,2.75) J12(2.25,2.75) J13(2.75,2.75) J14(3.25,2.75) K1(-3.25,2.25) K2(-2.75,2.25) K3(-2.25,2.25) K4(-1.75,2.25) K6(-0.75,2.25) K7(-0.25,2.25) K8(0.25,2.25) K9(0.75,2.25) K10(1.25,2.25) K11(1.75,2.25) K12(2.25,2.25) K13(2.75,2.25) K14(3.25,2.25) L2(-2.75,1.75) L3(-2.25,1.75) L4(-1.75,1.75) L12(2.25,1.75) L13(2.75,1.75) L14(3.25,1.75) M1(-3.25,1.25) M2(-2.75,1.25) M3(-2.25,1.25) M5(-1.25,1.25) M6(-0.75,1.25) M7(-0.25,1.25) M8(0.25,1.25) M9(0.75,1.25) M10(1.25,1.25) M12(2.25,1.25) M13(2.75,1.25) M14(3.25,1.25) N1(-3.25,0.75) N2(-2.75,0.75) N3(-2.25,0.75) N5(-1.25,0.75) N10(1.25,0.75) N12(2.25,0.75) N13(2.75,0.75) N14(3.25,0.75) P1(-3.25,0.25) P2(-2.75,0.25) P3(-2.25,0.25) P5(-1.25,0.25) P10(1.25,0.25) P12(2.25,0.25) P13(2.75,0.25) P14(3.25,0.25) R1(-3.25,-0.25) R2(-2.75,-0.25) R3(-2.25,-0.25) R5(-1.25,-0.25) R10(1.25,-0.25) R12(2.25,-0.25) R13(2.75,-0.25) R14(3.25,-0.25) T1(-3.25,-0.75) T2(-2.75,-0.75) T3(-2.25,-0.75) T5(-1.25,-0.75) T10(1.25,-0.75) T12(2.25,-0.75) T13(2.75,-0.75) T14(3.25,-0.75) U1(-3.25,-1.25) U2(-2.75,-1.25) U3(-2.25,-1.25) U5(-1.25,-1.25) U6(-0.75,-1.25) U7(-0.25,-1.25) U8(0.25,-1.25) U9(0.75,-1.25) U10(1.25,-1.25) U12(2.25,-1.25) U13(2.75,-1.25) U14(3.25,-1.25) V1(-3.25,-1.75) V2(-2.75,-1.75) V3(-2.25,-1.75) V12(2.25,-1.75) V13(2.75,-1.75) V14(3.25,-1.75) W1(-3.25,-2.25) W2(-2.75,-2.25) W3(-2.25,-2.25) W4(-1.75,-2.25) W5(-1.25,-2.25) W6(-0.75,-2.25) W7(-0.25,-2.25) W8(0.25,-2.25) W9(0.75,-2.25) W10(1.25,-2.25) W11(1.75,-2.25) W12(2.25,-2.25) W13(2.75,-2.25) W14(3.25,-2.25) Y2(-2.75,-2.75) Y3(-2.25,-2.75) Y4(-1.75,-2.75) Y5(-1.25,-2.75) Y6(-0.75,-2.75) Y7(-0.25,-2.75) Y8(0.25,-2.75) Y9(0.75,-2.75) Y10(1.25,-2.75) Y11(1.75,-2.75) Y12(2.25,-2.75) Y13(2.75,-2.75) Y14(3.25,-2.75)
Top Overlay:
  circle w0.1: c-3.2,8.5 r0.219
  lines w0.1: -6,7.05 -5.04,8 ; -6,7.31 -5.335,7.985 ; -6,7.43 -5.435,7.995 ; -6,7.56 -5.56,8 ; -6,7.69 -5.69,8 ; -6,7.79 -5.79,8 ; -6,7.89 -5.89,8 ; -5.99,7.19 -5.194,7.986 ; -5.988,6.952 -4.934,7.997 ; -6,-8 -6,8 6,8 6,-8 -6,-8 ; -5.75,-6.5 -5.75,6.5 5.75,6.5 5.75,-6.5 -5.75,-6.5
  text "AH" at -7,-6.55 h0.5
  text "A" at -6.6,6.95 h0.5
  text "2" at -2.85,8.25 h0.5
Top Assembly:
  lines w0.025: -6,-8 -6,8 6,8 6,-8 -6,-8
Mechanical 19:
  text "U5" at -1.25,-1.41 h0.2
  text "R5" at -1.25,-0.41 h0.2
  text "K2" at -2.75,2.09 h0.2
  text "W4" at -1.75,-2.41 h0.2
  text "Y4" at -1.75,-2.91 h0.2
  text "AA3" at -2.25,-3.49 h0.2
  text "AA5" at -1.25,-3.49 h0.2
  text "U9" at 0.75,-1.41 h0.2
  text "T10" at 1.25,-0.99 h0.2
  text "K6" at -0.75,2.09 h0.2
  text "M6" at -0.75,1.09 h0.2
  text "N5" at -1.25,0.59 h0.2
  text "K4" at -1.75,2.09 h0.2
  text "M7" at -0.25,1.09 h0.2
  text "P5" at -1.25,0.09 h0.2
  text "R10" at 1.25,-0.49 h0.2
  text "U8" at 0.25,-1.41 h0.2
  text "Y2" at -2.75,-2.91 h0.2
  text "Y5" at -1.25,-2.91 h0.2
  text "AA4" at -1.75,-3.49 h0.2
  text "AA6" at -0.75,-3.49 h0.2
  text "R3" at -2.25,-0.41 h0.2
  text "N14" at 3.25,0.51 h0.2
  text "AA12" at 2.25,-3.57 h0.2
  text "AA9" at 0.75,-3.49 h0.2
  text "Y6" at -0.75,-2.91 h0.2
  text "V14" at 3.25,-1.99 h0.2
  text "T14" at 3.25,-0.99 h0.2
  text "L14" at 3.25,1.51 h0.2
  text "H12" at 2.25,3.01 h0.2
  text "H9" at 0.75,3.09 h0.2
  text "H10" at 1.25,3.01 h0.2
  text "K1" at -3.25,2.09 h0.2
  text "R14" at 3.25,-0.49 h0.2
  text "U2" at -2.75,-1.41 h0.2
  text "W1" at -3.25,-2.41 h0.2
  text "AA8" at 0.25,-3.49 h0.2
  text "Y13" at 2.75,-2.99 h0.2
  text "W14" at 3.25,-2.49 h0.2
  text "R13" at 2.75,-0.49 h0.2
  text "R1" at -3.25,-0.41 h0.2
  text "P13" at 2.75,0.01 h0.2
  text "K14" at 3.25,2.01 h0.2
  text "J13" at 2.75,2.51 h0.2
  text "H8" at 0.25,3.09 h0.2
  text "H11" at 1.75,3.01 h0.2
  text "P14" at 3.25,0.01 h0.2
  text "W2" at -2.75,-2.41 h0.2
  text "AA11" at 1.75,-3.57 h0.2
  text "N1" at -3.25,0.59 h0.2
  text "L4" at -1.75,1.59 h0.2
  text "R2" at -2.75,-0.41 h0.2
  text "Y14" at 3.25,-2.99 h0.2
  text "U7" at -0.25,-1.41 h0.2
  text "U6" at -0.75,-1.41 h0.2
  text "U10" at 1.25,-1.49 h0.2
  text "P3" at -2.25,0.09 h0.2
  text "P10" at 1.25,0.01 h0.2
  text "N10" at 1.25,0.51 h0.2
  text "M9" at 0.75,1.09 h0.2
  text "M8" at 0.25,1.09 h0.2
  text "M5" at -1.25,1.09 h0.2
  text "M10" at 1.25,1.01 h0.2
  text "J14" at 3.25,2.51 h0.2
  text "H13" at 2.75,3.01 h0.2
  text "AA7" at -0.25,-3.49 h0.2
  text "AA2" at -2.75,-3.49 h0.2
  text "AA13" at 2.75,-3.57 h0.2
  text "AA10" at 1.25,-3.57 h0.2
  text "J11" at 1.75,2.51 h0.2
  text "N12" at 2.25,0.51 h0.2
  text "T12" at 2.25,-0.99 h0.2
  text "Y11" at 1.75,-2.99 h0.2
  text "K11" at 1.75,2.01 h0.2
  text "N13" at 2.75,0.51 h0.2
  text "T13" at 2.75,-0.99 h0.2
  text "W11" at 1.75,-2.49 h0.2
  text "W12" at 2.25,-2.49 h0.2
  text "Y12" at 2.25,-2.99 h0.2
  text "W10" at 1.25,-2.49 h0.2
  text "Y10" at 1.25,-2.99 h0.2
  text "W9" at 0.75,-2.41 h0.2
  text "Y9" at 0.75,-2.91 h0.2
  text "K7" at -0.25,2.09 h0.2
  text "J7" at -0.25,2.59 h0.2
  text "W8" at 0.25,-2.41 h0.2
  text "K8" at 0.25,2.09 h0.2
  text "J8" at 0.25,2.59 h0.2
  text "K9" at 0.75,2.09 h0.2
  text "J9" at 0.75,2.59 h0.2
  text "K10" at 1.25,2.01 h0.2
  text "J10" at 1.25,2.51 h0.2
  text "J12" at 2.25,2.51 h0.2
  text "K12" at 2.25,2.01 h0.2
  text "K13" at 2.75,2.01 h0.2
  text "L13" at 2.75,1.51 h0.2
  text "Y8" at 0.25,-2.91 h0.2
  text "L12" at 2.25,1.51 h0.2
  text "M12" at 2.25,1.01 h0.2
  text "M13" at 2.75,1.01 h0.2
  text "M14" at 3.25,1.01 h0.2
  text "U14" at 3.25,-1.49 h0.2
  text "U13" at 2.75,-1.49 h0.2
  text "U12" at 2.25,-1.49 h0.2
  text "V13" at 2.75,-1.99 h0.2
  text "V12" at 2.25,-1.99 h0.2
  text "W13" at 2.75,-2.49 h0.2
  text "W7" at -0.25,-2.41 h0.2
  text "Y7" at -0.25,-2.91 h0.2
  text "H14" at 3.25,3.01 h0.2
  text "H1" at -3.25,3.09 h0.2
  text "D14" at 3.25,5.01 h0.2
  text "D1" at -3.25,5.09 h0.2
  text "B2" at -2.75,6.09 h0.2
  text "B13" at 2.75,6.01 h0.2
  text "AH9" at 0.75,-6.99 h0.2
  text "AH6" at -0.75,-6.99 h0.2
  text "AH4" at -1.75,-6.99 h0.2
  text "AH11" at 1.75,-7.07 h0.2
  text "AG2" at -2.75,-6.49 h0.2
  text "AG13" at 2.75,-6.57 h0.2
  text "AE14" at 3.25,-5.57 h0.2
  text "AE1" at -3.25,-5.49 h0.2
  text "AA14" at 3.25,-3.57 h0.2
  text "AA1" at -3.25,-3.49 h0.2
  text "A9" at 0.75,6.59 h0.2
  text "A6" at -0.75,6.59 h0.2
  text "A4" at -1.75,6.59 h0.2
  text "A11" at 1.75,6.51 h0.2
  text "J6" at -0.75,2.59 h0.2
  text "J5" at -1.25,2.59 h0.2
  text "J4" at -1.75,2.59 h0.2
  text "J3" at -2.25,2.59 h0.2
  text "R12" at 2.25,-0.49 h0.2
  text "P12" at 2.25,0.01 h0.2
  text "T1" at -3.25,-0.91 h0.2
  text "P1" at -3.25,0.09 h0.2
  text "T3" at -2.25,-0.91 h0.2
  text "P2" at -2.75,0.09 h0.2
  text "T2" at -2.75,-0.91 h0.2
  text "U1" at -3.25,-1.41 h0.2
  text "V1" at -3.25,-1.91 h0.2
  text "N3" at -2.25,0.59 h0.2
  text "M3" at -2.25,1.09 h0.2
  text "L3" at -2.25,1.59 h0.2
  text "L2" at -2.75,1.59 h0.2
  text "K3" at -2.25,2.09 h0.2
  text "Y3" at -2.25,-2.91 h0.2
  text "W3" at -2.25,-2.41 h0.2
  text "N2" at -2.75,0.59 h0.2
  text "M1" at -3.25,1.09 h0.2
  text "M2" at -2.75,1.09 h0.2
  text "U3" at -2.25,-1.41 h0.2
  text "V3" at -2.25,-1.91 h0.2
  text "V2" at -2.75,-1.91 h0.2
  text "H3" at -2.25,3.09 h0.2
  text "H4" at -1.75,3.09 h0.2
  text "J2" at -2.75,2.59 h0.2
  text "W5" at -1.25,-2.41 h0.2
  text "W6" at -0.75,-2.41 h0.2
  text "H5" at -1.25,3.09 h0.2
  text "H6" at -0.75,3.09 h0.2
  text "T5" at -1.25,-0.91 h0.2
Mechanical 23:
  lines w0.025: -6.254,-8.254 -6.254,8.254 ; -6.254,-8.254 6.254,-8.254 ; -6.254,-8.254 -6.254,8.254 ; -6.254,-8.254 6.254,-8.254 ; -6.254,-8.254 -6.254,8.254 ; -6.254,-8.254 6.254,-8.254 ; -6.254,8.254 6.254,8.254 ; -6.254,8.254 6.254,8.254 ; -6.254,8.254 6.254,8.254 ; 6.254,-8.254 6.254,8.254 ; 6.254,-8.254 6.254,8.254 ; 6.254,-8.254 6.254,8.254
Mechanical 24:
  dashed: -6.254,-8.254 6.254,-8.254 6.254,8.254 -6.254,8.254
3D body "User Library-BGA153NP50_14X14_1300X1150X80B30.step": height 0.8, standoff 0, extent -5.75,-6.5 5.75,6.5

## BNX026_SM_FP [mm]
height 0.52
pads (6):
  rect 2x1.5 smd: 1(2.7,8.35) 2(14.8,8.35) 3(2.7,4.05) 4(14.8,4.05)
  rect 7.5x1.5 smd: 4(9.75,1.5)
  rect 3x1.5 smd: 4(12,11)
Top Overlay:
  lines w0.254: 2.5,2.5 2.5,1.5 5.5,1.5 ; 2.5,5.5 2.5,6.75 ; 2.5,10 2.5,11 10,11 ; 14,1.5 15,1.5 15,2.5 ; 14,11 15,11 15,10 ; 15,5.5 15,6.75
Top Designator:
  lines w0.254: 2.5,1.5 15,1.5 15,11 2.5,11 2.5,1.5
  text ".Designator" at -3.946,5.404 h2.54
3D body "User Library-BNX022.step": height 3.1, standoff 0, extent 2.7,1.7 14.8,10.8